# Altium footprint library 2.11-TQFP封装.PcbLib: 76 footprints (part 5 of 5)
Each footprint in its own frame and in the unit in brackets; x right, y up, seen from the top. Pads: shape width x height; smd on the part's side, far side on the other; paste and mask are expansions set on the pad; w line width, h text height; cw(c..) or ccw(c..) is an arc to the next point about the centre after c.
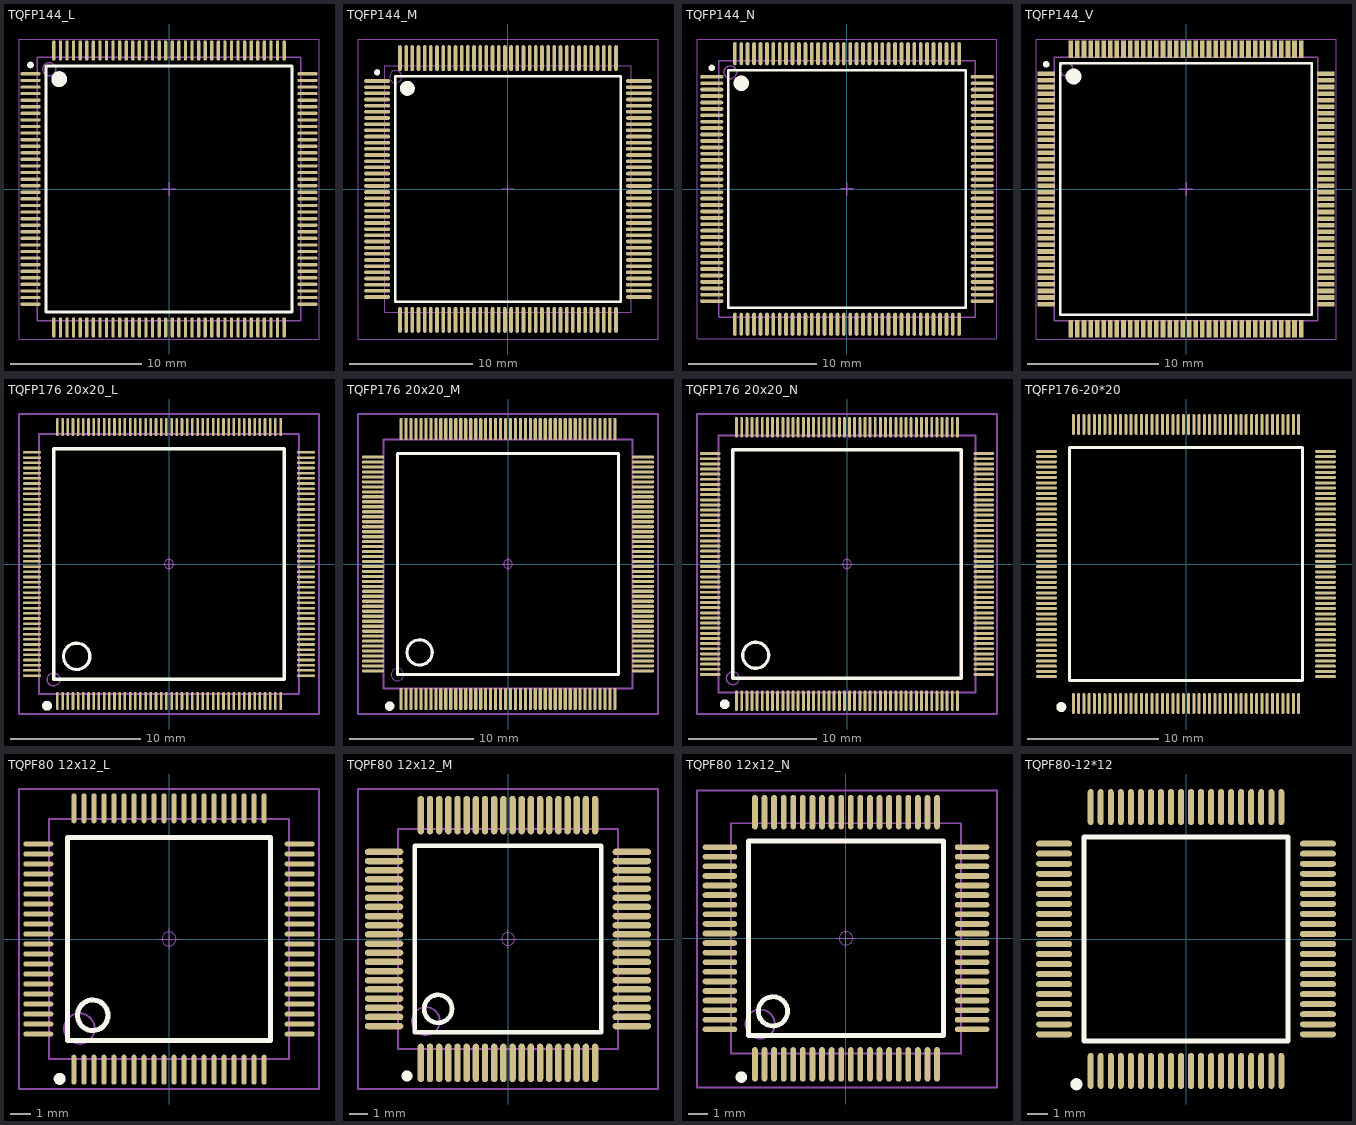
[diagram p4: the footprints below, top view; thin cyan lines are the x and y axes]

## TQFP144_L [mm] "Thin QFP, 144-Leads, Body 20x20mm, Pitch 0.5mm, IPC High Density      [ PCBѧϰȺ514746572 ]"
height 1.6
pads (144):
  oval 1.55x0.25 smd: 1(-10.525,8.75) 2(-10.525,8.25) 3(-10.525,7.75) 4(-10.525,7.25) 5(-10.525,6.75) 6(-10.525,6.25) 7(-10.525,5.75) 8(-10.525,5.25) 9(-10.525,4.75) 10(-10.525,4.25) 11(-10.525,3.75) 12(-10.525,3.25) 13(-10.525,2.75) 14(-10.525,2.25) 15(-10.525,1.75) 16(-10.525,1.25) 17(-10.525,0.75) 18(-10.525,0.25) 19(-10.525,-0.25) 20(-10.525,-0.75) 21(-10.525,-1.25) 22(-10.525,-1.75) 23(-10.525,-2.25) 24(-10.525,-2.75) 25(-10.525,-3.25) 26(-10.525,-3.75) 27(-10.525,-4.25) 28(-10.525,-4.75) 29(-10.525,-5.25) 30(-10.525,-5.75) 31(-10.525,-6.25) 32(-10.525,-6.75) 33(-10.525,-7.25) 34(-10.525,-7.75) 35(-10.525,-8.25) 36(-10.525,-8.75) 73(10.525,-8.75) 74(10.525,-8.25) 75(10.525,-7.75) 76(10.525,-7.25) 77(10.525,-6.75) 78(10.525,-6.25) 79(10.525,-5.75) 80(10.525,-5.25) 81(10.525,-4.75) 82(10.525,-4.25) 83(10.525,-3.75) 84(10.525,-3.25) 85(10.525,-2.75) 86(10.525,-2.25) 87(10.525,-1.75) 88(10.525,-1.25) 89(10.525,-0.75) 90(10.525,-0.25) 91(10.525,0.25) 92(10.525,0.75) 93(10.525,1.25) 94(10.525,1.75) 95(10.525,2.25) 96(10.525,2.75) 97(10.525,3.25) 98(10.525,3.75) 99(10.525,4.25) 100(10.525,4.75) 101(10.525,5.25) 102(10.525,5.75) 103(10.525,6.25) 104(10.525,6.75) 105(10.525,7.25) 106(10.525,7.75) 107(10.525,8.25) 108(10.525,8.75)
  oval 0.25x1.55 smd: 37(-8.75,-10.525) 38(-8.25,-10.525) 39(-7.75,-10.525) 40(-7.25,-10.525) 41(-6.75,-10.525) 42(-6.25,-10.525) 43(-5.75,-10.525) 44(-5.25,-10.525) 45(-4.75,-10.525) 46(-4.25,-10.525) 47(-3.75,-10.525) 48(-3.25,-10.525) 49(-2.75,-10.525) 50(-2.25,-10.525) 51(-1.75,-10.525) 52(-1.25,-10.525) 53(-0.75,-10.525) 54(-0.25,-10.525) 55(0.25,-10.525) 56(0.75,-10.525) 57(1.25,-10.525) 58(1.75,-10.525) 59(2.25,-10.525) 60(2.75,-10.525) 61(3.25,-10.525) 62(3.75,-10.525) 63(4.25,-10.525) 64(4.75,-10.525) 65(5.25,-10.525) 66(5.75,-10.525) 67(6.25,-10.525) 68(6.75,-10.525) 69(7.25,-10.525) 70(7.75,-10.525) 71(8.25,-10.525) 72(8.75,-10.525) 109(8.75,10.525) 110(8.25,10.525) 111(7.75,10.525) 112(7.25,10.525) 113(6.75,10.525) 114(6.25,10.525) 115(5.75,10.525) 116(5.25,10.525) 117(4.75,10.525) 118(4.25,10.525) 119(3.75,10.525) 120(3.25,10.525) 121(2.75,10.525) 122(2.25,10.525) 123(1.75,10.525) 124(1.25,10.525) 125(0.75,10.525) 126(0.25,10.525) 127(-0.25,10.525) 128(-0.75,10.525) 129(-1.25,10.525) 130(-1.75,10.525) 131(-2.25,10.525) 132(-2.75,10.525) 133(-3.25,10.525) 134(-3.75,10.525) 135(-4.25,10.525) 136(-4.75,10.525) 137(-5.25,10.525) 138(-5.75,10.525) 139(-6.25,10.525) 140(-6.75,10.525) 141(-7.25,10.525) 142(-7.75,10.525) 143(-8.25,10.525) 144(-8.75,10.525)
Top Overlay:
  circle w0.6: c-8.35,8.35 r0.3
  circle w0.25: c-10.525,9.425 r0.125
  lines w0.2: -9.35,-9.35 9.35,-9.35 9.35,9.35 -9.35,9.35 -9.35,-9.35
Mechanical 13:
  circle w0.1: c-9.1,9.1 r0.5
  lines w0.1: -10,-10 10,-10 10,10 -10,10 -10,-10
Mechanical 15:
  lines w0.05: -11.4,-11.4 11.4,-11.4 11.4,11.4 -11.4,11.4 -11.4,-11.4
  lines w0.1: -0.5,0 0.5,0 ; 0,-0.5 0,0.5
3D body "TQFP144_20x20.STEP": height 1.05, standoff 0, extent -11.002,-11.002 11.002,11.002

## TQFP144_M [mm] "Thin QFP, 144-Leads, Body 20x20mm, Pitch 0.5mm, IPC Low Density      [ PCBѧϰȺ514746572 ]"
height 1.6
pads (144):
  oval 2.1x0.3 smd: 1(-10.6,8.75) 2(-10.6,8.25) 3(-10.6,7.75) 4(-10.6,7.25) 5(-10.6,6.75) 6(-10.6,6.25) 7(-10.6,5.75) 8(-10.6,5.25) 9(-10.6,4.75) 10(-10.6,4.25) 11(-10.6,3.75) 12(-10.6,3.25) 13(-10.6,2.75) 14(-10.6,2.25) 15(-10.6,1.75) 16(-10.6,1.25) 17(-10.6,0.75) 18(-10.6,0.25) 19(-10.6,-0.25) 20(-10.6,-0.75) 21(-10.6,-1.25) 22(-10.6,-1.75) 23(-10.6,-2.25) 24(-10.6,-2.75) 25(-10.6,-3.25) 26(-10.6,-3.75) 27(-10.6,-4.25) 28(-10.6,-4.75) 29(-10.6,-5.25) 30(-10.6,-5.75) 31(-10.6,-6.25) 32(-10.6,-6.75) 33(-10.6,-7.25) 34(-10.6,-7.75) 35(-10.6,-8.25) 36(-10.6,-8.75) 73(10.6,-8.75) 74(10.6,-8.25) 75(10.6,-7.75) 76(10.6,-7.25) 77(10.6,-6.75) 78(10.6,-6.25) 79(10.6,-5.75) 80(10.6,-5.25) 81(10.6,-4.75) 82(10.6,-4.25) 83(10.6,-3.75) 84(10.6,-3.25) 85(10.6,-2.75) 86(10.6,-2.25) 87(10.6,-1.75) 88(10.6,-1.25) 89(10.6,-0.75) 90(10.6,-0.25) 91(10.6,0.25) 92(10.6,0.75) 93(10.6,1.25) 94(10.6,1.75) 95(10.6,2.25) 96(10.6,2.75) 97(10.6,3.25) 98(10.6,3.75) 99(10.6,4.25) 100(10.6,4.75) 101(10.6,5.25) 102(10.6,5.75) 103(10.6,6.25) 104(10.6,6.75) 105(10.6,7.25) 106(10.6,7.75) 107(10.6,8.25) 108(10.6,8.75)
  oval 0.3x2.1 smd: 37(-8.75,-10.6) 38(-8.25,-10.6) 39(-7.75,-10.6) 40(-7.25,-10.6) 41(-6.75,-10.6) 42(-6.25,-10.6) 43(-5.75,-10.6) 44(-5.25,-10.6) 45(-4.75,-10.6) 46(-4.25,-10.6) 47(-3.75,-10.6) 48(-3.25,-10.6) 49(-2.75,-10.6) 50(-2.25,-10.6) 51(-1.75,-10.6) 52(-1.25,-10.6) 53(-0.75,-10.6) 54(-0.25,-10.6) 55(0.25,-10.6) 56(0.75,-10.6) 57(1.25,-10.6) 58(1.75,-10.6) 59(2.25,-10.6) 60(2.75,-10.6) 61(3.25,-10.6) 62(3.75,-10.6) 63(4.25,-10.6) 64(4.75,-10.6) 65(5.25,-10.6) 66(5.75,-10.6) 67(6.25,-10.6) 68(6.75,-10.6) 69(7.25,-10.6) 70(7.75,-10.6) 71(8.25,-10.6) 72(8.75,-10.6) 109(8.75,10.6) 110(8.25,10.6) 111(7.75,10.6) 112(7.25,10.6) 113(6.75,10.6) 114(6.25,10.6) 115(5.75,10.6) 116(5.25,10.6) 117(4.75,10.6) 118(4.25,10.6) 119(3.75,10.6) 120(3.25,10.6) 121(2.75,10.6) 122(2.25,10.6) 123(1.75,10.6) 124(1.25,10.6) 125(0.75,10.6) 126(0.25,10.6) 127(-0.25,10.6) 128(-0.75,10.6) 129(-1.25,10.6) 130(-1.75,10.6) 131(-2.25,10.6) 132(-2.75,10.6) 133(-3.25,10.6) 134(-3.75,10.6) 135(-4.25,10.6) 136(-4.75,10.6) 137(-5.25,10.6) 138(-5.75,10.6) 139(-6.25,10.6) 140(-6.75,10.6) 141(-7.25,10.6) 142(-7.75,10.6) 143(-8.25,10.6) 144(-8.75,10.6)
Top Overlay:
  circle w0.25: c-10.6,9.45 r0.125
  circle w0.6: c-8.15,8.15 r0.3
  lines w0.2: -9.15,-9.15 -9.15,9.15 9.15,9.15 9.15,-9.15 -9.15,-9.15
Mechanical 13:
  circle w0.1: c-9.1,9.1 r0.5
  lines w0.1: -10,-10 -10,10 10,10 10,-10 -10,-10
Mechanical 15:
  lines w0.05: -12.15,-12.15 -12.15,12.15 12.15,12.15 12.15,-12.15 -12.15,-12.15
  lines w0.1: -0.5,0 0.5,0 ; 0,-0.5 0,0.5
3D body "TQFP144_20x20.STEP": height 1.05, standoff 0, extent -11.002,-11.002 11.002,11.002

## TQFP144_N [mm] "Thin QFP, 144-Leads, Body 20x20mm, Pitch 0.5mm, IPC Medium Density      [ PCBѧϰȺ514746572 ]"
height 1.6
pads (144):
  oval 1.8x0.3 smd: 1(-10.55,8.75) 2(-10.55,8.25) 3(-10.55,7.75) 4(-10.55,7.25) 5(-10.55,6.75) 6(-10.55,6.25) 7(-10.55,5.75) 8(-10.55,5.25) 9(-10.55,4.75) 10(-10.55,4.25) 11(-10.55,3.75) 12(-10.55,3.25) 13(-10.55,2.75) 14(-10.55,2.25) 15(-10.55,1.75) 16(-10.55,1.25) 17(-10.55,0.75) 18(-10.55,0.25) 19(-10.55,-0.25) 20(-10.55,-0.75) 21(-10.55,-1.25) 22(-10.55,-1.75) 23(-10.55,-2.25) 24(-10.55,-2.75) 25(-10.55,-3.25) 26(-10.55,-3.75) 27(-10.55,-4.25) 28(-10.55,-4.75) 29(-10.55,-5.25) 30(-10.55,-5.75) 31(-10.55,-6.25) 32(-10.55,-6.75) 33(-10.55,-7.25) 34(-10.55,-7.75) 35(-10.55,-8.25) 36(-10.55,-8.75) 73(10.55,-8.75) 74(10.55,-8.25) 75(10.55,-7.75) 76(10.55,-7.25) 77(10.55,-6.75) 78(10.55,-6.25) 79(10.55,-5.75) 80(10.55,-5.25) 81(10.55,-4.75) 82(10.55,-4.25) 83(10.55,-3.75) 84(10.55,-3.25) 85(10.55,-2.75) 86(10.55,-2.25) 87(10.55,-1.75) 88(10.55,-1.25) 89(10.55,-0.75) 90(10.55,-0.25) 91(10.55,0.25) 92(10.55,0.75) 93(10.55,1.25) 94(10.55,1.75) 95(10.55,2.25) 96(10.55,2.75) 97(10.55,3.25) 98(10.55,3.75) 99(10.55,4.25) 100(10.55,4.75) 101(10.55,5.25) 102(10.55,5.75) 103(10.55,6.25) 104(10.55,6.75) 105(10.55,7.25) 106(10.55,7.75) 107(10.55,8.25) 108(10.55,8.75)
  oval 0.3x1.8 smd: 37(-8.75,-10.55) 38(-8.25,-10.55) 39(-7.75,-10.55) 40(-7.25,-10.55) 41(-6.75,-10.55) 42(-6.25,-10.55) 43(-5.75,-10.55) 44(-5.25,-10.55) 45(-4.75,-10.55) 46(-4.25,-10.55) 47(-3.75,-10.55) 48(-3.25,-10.55) 49(-2.75,-10.55) 50(-2.25,-10.55) 51(-1.75,-10.55) 52(-1.25,-10.55) 53(-0.75,-10.55) 54(-0.25,-10.55) 55(0.25,-10.55) 56(0.75,-10.55) 57(1.25,-10.55) 58(1.75,-10.55) 59(2.25,-10.55) 60(2.75,-10.55) 61(3.25,-10.55) 62(3.75,-10.55) 63(4.25,-10.55) 64(4.75,-10.55) 65(5.25,-10.55) 66(5.75,-10.55) 67(6.25,-10.55) 68(6.75,-10.55) 69(7.25,-10.55) 70(7.75,-10.55) 71(8.25,-10.55) 72(8.75,-10.55) 109(8.75,10.55) 110(8.25,10.55) 111(7.75,10.55) 112(7.25,10.55) 113(6.75,10.55) 114(6.25,10.55) 115(5.75,10.55) 116(5.25,10.55) 117(4.75,10.55) 118(4.25,10.55) 119(3.75,10.55) 120(3.25,10.55) 121(2.75,10.55) 122(2.25,10.55) 123(1.75,10.55) 124(1.25,10.55) 125(0.75,10.55) 126(0.25,10.55) 127(-0.25,10.55) 128(-0.75,10.55) 129(-1.25,10.55) 130(-1.75,10.55) 131(-2.25,10.55) 132(-2.75,10.55) 133(-3.25,10.55) 134(-3.75,10.55) 135(-4.25,10.55) 136(-4.75,10.55) 137(-5.25,10.55) 138(-5.75,10.55) 139(-6.25,10.55) 140(-6.75,10.55) 141(-7.25,10.55) 142(-7.75,10.55) 143(-8.25,10.55) 144(-8.75,10.55)
Top Overlay:
  circle w0.25: c-10.55,9.45 r0.125
  circle w0.6: c-8.25,8.25 r0.3
  lines w0.2: -9.25,-9.25 -9.25,9.25 9.25,9.25 9.25,-9.25 -9.25,-9.25
Mechanical 13:
  circle w0.1: c-9.1,9.1 r0.5
  lines w0.1: -10,-10 -10,10 10,10 10,-10 -10,-10
Mechanical 15:
  lines w0.05: -11.7,-11.7 -11.7,11.7 11.7,11.7 11.7,-11.7 -11.7,-11.7
  lines w0.1: -0.5,0 0.5,0 ; 0,-0.5 0,0.5
3D body "TQFP144_20x20.STEP": height 1.05, standoff 0, extent -11.002,-11.002 11.002,11.002

## TQFP144_V [mm] "Thin QFP, 144-Leads, Body 20x20mm, Pitch 0.5mm, ST Recommended      [ PCBѧϰȺ514746572 ]"
height 1.6
pads (144):
  rect 1.35x0.35 smd: 1(-10.625,8.75) 2(-10.625,8.25) 3(-10.625,7.75) 4(-10.625,7.25) 5(-10.625,6.75) 6(-10.625,6.25) 7(-10.625,5.75) 8(-10.625,5.25) 9(-10.625,4.75) 10(-10.625,4.25) 11(-10.625,3.75) 12(-10.625,3.25) 13(-10.625,2.75) 14(-10.625,2.25) 15(-10.625,1.75) 16(-10.625,1.25) 17(-10.625,0.75) 18(-10.625,0.25) 19(-10.625,-0.25) 20(-10.625,-0.75) 21(-10.625,-1.25) 22(-10.625,-1.75) 23(-10.625,-2.25) 24(-10.625,-2.75) 25(-10.625,-3.25) 26(-10.625,-3.75) 27(-10.625,-4.25) 28(-10.625,-4.75) 29(-10.625,-5.25) 30(-10.625,-5.75) 31(-10.625,-6.25) 32(-10.625,-6.75) 33(-10.625,-7.25) 34(-10.625,-7.75) 35(-10.625,-8.25) 36(-10.625,-8.75) 73(10.625,-8.75) 74(10.625,-8.25) 75(10.625,-7.75) 76(10.625,-7.25) 77(10.625,-6.75) 78(10.625,-6.25) 79(10.625,-5.75) 80(10.625,-5.25) 81(10.625,-4.75) 82(10.625,-4.25) 83(10.625,-3.75) 84(10.625,-3.25) 85(10.625,-2.75) 86(10.625,-2.25) 87(10.625,-1.75) 88(10.625,-1.25) 89(10.625,-0.75) 90(10.625,-0.25) 91(10.625,0.25) 92(10.625,0.75) 93(10.625,1.25) 94(10.625,1.75) 95(10.625,2.25) 96(10.625,2.75) 97(10.625,3.25) 98(10.625,3.75) 99(10.625,4.25) 100(10.625,4.75) 101(10.625,5.25) 102(10.625,5.75) 103(10.625,6.25) 104(10.625,6.75) 105(10.625,7.25) 106(10.625,7.75) 107(10.625,8.25) 108(10.625,8.75)
  rect 0.35x1.35 smd: 37(-8.75,-10.625) 38(-8.25,-10.625) 39(-7.75,-10.625) 40(-7.25,-10.625) 41(-6.75,-10.625) 42(-6.25,-10.625) 43(-5.75,-10.625) 44(-5.25,-10.625) 45(-4.75,-10.625) 46(-4.25,-10.625) 47(-3.75,-10.625) 48(-3.25,-10.625) 49(-2.75,-10.625) 50(-2.25,-10.625) 51(-1.75,-10.625) 52(-1.25,-10.625) 53(-0.75,-10.625) 54(-0.25,-10.625) 55(0.25,-10.625) 56(0.75,-10.625) 57(1.25,-10.625) 58(1.75,-10.625) 59(2.25,-10.625) 60(2.75,-10.625) 61(3.25,-10.625) 62(3.75,-10.625) 63(4.25,-10.625) 64(4.75,-10.625) 65(5.25,-10.625) 66(5.75,-10.625) 67(6.25,-10.625) 68(6.75,-10.625) 69(7.25,-10.625) 70(7.75,-10.625) 71(8.25,-10.625) 72(8.75,-10.625) 109(8.75,10.625) 110(8.25,10.625) 111(7.75,10.625) 112(7.25,10.625) 113(6.75,10.625) 114(6.25,10.625) 115(5.75,10.625) 116(5.25,10.625) 117(4.75,10.625) 118(4.25,10.625) 119(3.75,10.625) 120(3.25,10.625) 121(2.75,10.625) 122(2.25,10.625) 123(1.75,10.625) 124(1.25,10.625) 125(0.75,10.625) 126(0.25,10.625) 127(-0.25,10.625) 128(-0.75,10.625) 129(-1.25,10.625) 130(-1.75,10.625) 131(-2.25,10.625) 132(-2.75,10.625) 133(-3.25,10.625) 134(-3.75,10.625) 135(-4.25,10.625) 136(-4.75,10.625) 137(-5.25,10.625) 138(-5.75,10.625) 139(-6.25,10.625) 140(-6.75,10.625) 141(-7.25,10.625) 142(-7.75,10.625) 143(-8.25,10.625) 144(-8.75,10.625)
Top Overlay:
  circle w0.6: c-8.55,8.55 r0.3
  circle w0.25: c-10.625,9.475 r0.125
  lines w0.2: -9.55,-9.55 9.55,-9.55 9.55,9.55 -9.55,9.55 -9.55,-9.55
Mechanical 13:
  circle w0.1: c-9.1,9.1 r0.5
  lines w0.1: -10,-10 10,-10 10,10 -10,10 -10,-10
Mechanical 15:
  lines w0.05: -11.4,-11.4 11.4,-11.4 11.4,11.4 -11.4,11.4 -11.4,-11.4
  lines w0.1: -0.5,0 0.5,0 ; 0,-0.5 0,0.5
3D body: height 1.6, standoff 0.05, extent -10,-10 10,10

## TQFP176 20x20_L [mm] "176脚，体宽：20x20mm, 脚距：0.4mm      [ PCB学习群514746572 ]"
height 1.6
pads (176):
  oval 0.2x1.4 smd: 1(-8.6,-10.552) 2(-8.2,-10.552) 3(-7.8,-10.552) 4(-7.4,-10.552) 5(-7,-10.552) 6(-6.6,-10.552) 7(-6.2,-10.552) 8(-5.8,-10.552) 9(-5.4,-10.552) 10(-5,-10.552) 11(-4.6,-10.552) 12(-4.2,-10.552) 13(-3.8,-10.552) 14(-3.4,-10.552) 15(-3,-10.552) 16(-2.6,-10.552) 17(-2.2,-10.552) 18(-1.8,-10.552) 19(-1.4,-10.552) 20(-1,-10.552) 21(-0.6,-10.552) 22(-0.2,-10.552) 23(0.2,-10.552) 24(0.6,-10.552) 25(1,-10.552) 26(1.4,-10.552) 27(1.8,-10.552) 28(2.2,-10.552) 29(2.6,-10.552) 30(3,-10.552) 31(3.4,-10.552) 32(3.8,-10.552) 33(4.2,-10.552) 34(4.6,-10.552) 35(5,-10.552) 36(5.4,-10.552) 37(5.8,-10.552) 38(6.2,-10.552) 39(6.6,-10.552) 40(7,-10.552) 41(7.4,-10.552) 42(7.8,-10.552) 43(8.2,-10.552) 44(8.6,-10.552) 89(8.6,10.552) 90(8.2,10.552) 91(7.8,10.552) 92(7.4,10.552) 93(7,10.552) 94(6.6,10.552) 95(6.2,10.552) 96(5.8,10.552) 97(5.4,10.552) 98(5,10.552) 99(4.6,10.552) 100(4.2,10.552) 101(3.8,10.552) 102(3.4,10.552) 103(3,10.552) 104(2.6,10.552) 105(2.2,10.552) 106(1.8,10.552) 107(1.4,10.552) 108(1,10.552) 109(0.6,10.552) 110(0.2,10.552) 111(-0.2,10.552) 112(-0.6,10.552) 113(-1,10.552) 114(-1.4,10.552) 115(-1.8,10.552) 116(-2.2,10.552) 117(-2.6,10.552) 118(-3,10.552) 119(-3.4,10.552) 120(-3.8,10.552) 121(-4.2,10.552) 122(-4.6,10.552) 123(-5,10.552) 124(-5.4,10.552) 125(-5.8,10.552) 126(-6.2,10.552) 127(-6.6,10.552) 128(-7,10.552) 129(-7.4,10.552) 130(-7.8,10.552) 131(-8.2,10.552) 132(-8.6,10.552)
  oval 1.4x0.2 smd: 45(10.552,-8.6) 46(10.552,-8.2) 47(10.552,-7.8) 48(10.552,-7.4) 49(10.552,-7) 50(10.552,-6.6) 51(10.552,-6.2) 52(10.552,-5.8) 53(10.552,-5.4) 54(10.552,-5) 55(10.552,-4.6) 56(10.552,-4.2) 57(10.552,-3.8) 58(10.552,-3.4) 59(10.552,-3) 60(10.552,-2.6) 61(10.552,-2.2) 62(10.552,-1.8) 63(10.552,-1.4) 64(10.552,-1) 65(10.552,-0.6) 66(10.552,-0.2) 67(10.552,0.2) 68(10.552,0.6) 69(10.552,1) 70(10.552,1.4) 71(10.552,1.8) 72(10.552,2.2) 73(10.552,2.6) 74(10.552,3) 75(10.552,3.4) 76(10.552,3.8) 77(10.552,4.2) 78(10.552,4.6) 79(10.552,5) 80(10.552,5.4) 81(10.552,5.8) 82(10.552,6.2) 83(10.552,6.6) 84(10.552,7) 85(10.552,7.4) 86(10.552,7.8) 87(10.552,8.2) 88(10.552,8.6) 133(-10.552,8.6) 134(-10.552,8.2) 135(-10.552,7.8) 136(-10.552,7.4) 137(-10.552,7) 138(-10.552,6.6) 139(-10.552,6.2) 140(-10.552,5.8) 141(-10.552,5.4) 142(-10.552,5) 143(-10.552,4.6) 144(-10.552,4.2) 145(-10.552,3.8) 146(-10.552,3.4) 147(-10.552,3) 148(-10.552,2.6) 149(-10.552,2.2) 150(-10.552,1.8) 151(-10.552,1.4) 152(-10.552,1) 153(-10.552,0.6) 154(-10.552,0.2) 155(-10.552,-0.2) 156(-10.552,-0.6) 157(-10.552,-1) 158(-10.552,-1.4) 159(-10.552,-1.8) 160(-10.552,-2.2) 161(-10.552,-2.6) 162(-10.552,-3) 163(-10.552,-3.4) 164(-10.552,-3.8) 165(-10.552,-4.2) 166(-10.552,-4.6) 167(-10.552,-5) 168(-10.552,-5.4) 169(-10.552,-5.8) 170(-10.552,-6.2) 171(-10.552,-6.6) 172(-10.552,-7) 173(-10.552,-7.4) 174(-10.552,-7.8) 175(-10.552,-8.2) 176(-10.552,-8.6)
Top Overlay:
  circle w0.508: c-9.398,-10.922 r0.127
  circle w0.254: c-7.112,-7.112 r1.016
  lines w0.254: -8.89,-8.89 8.89,-8.89 8.89,8.89 -8.89,8.89 -8.89,-8.89
Mechanical 13:
  circle w0.1: c-8.894,-8.894 r0.5
  lines w0.15: -10,-10 -10,10 10,10 10,-10 -10,-10
Mechanical 15:
  circle w0.05: c0,0 r0.35
  lines w0.05: -0.5,0 0.5,0 ; 0,-0.5 0,0.5
  lines w0.15: -11.557,-11.557 11.557,-11.557 11.557,11.557 -11.557,11.557 -11.557,-11.557
3D body "TQFP176_20x20.STEP": height 1.05, standoff 0, extent -11.002,-11.002 11.002,11.002

## TQFP176 20x20_M [mm] "176脚，体宽：20x20mm, 脚距：0.4mm      [ PCB学习群514746572 ]"
height 1.6
pads (176):
  oval 0.26x1.8 smd: 1(-8.6,-10.857) 2(-8.2,-10.857) 3(-7.8,-10.857) 4(-7.4,-10.857) 5(-7,-10.857) 6(-6.6,-10.857) 7(-6.2,-10.857) 8(-5.8,-10.857) 9(-5.4,-10.857) 10(-5,-10.857) 11(-4.6,-10.857) 12(-4.2,-10.857) 13(-3.8,-10.857) 14(-3.4,-10.857) 15(-3,-10.857) 16(-2.6,-10.857) 17(-2.2,-10.857) 18(-1.8,-10.857) 19(-1.4,-10.857) 20(-1,-10.857) 21(-0.6,-10.857) 22(-0.2,-10.857) 23(0.2,-10.857) 24(0.6,-10.857) 25(1,-10.857) 26(1.4,-10.857) 27(1.8,-10.857) 28(2.2,-10.857) 29(2.6,-10.857) 30(3,-10.857) 31(3.4,-10.857) 32(3.8,-10.857) 33(4.2,-10.857) 34(4.6,-10.857) 35(5,-10.857) 36(5.4,-10.857) 37(5.8,-10.857) 38(6.2,-10.857) 39(6.6,-10.857) 40(7,-10.857) 41(7.4,-10.857) 42(7.8,-10.857) 43(8.2,-10.857) 44(8.6,-10.857) 89(8.6,10.857) 90(8.2,10.857) 91(7.8,10.857) 92(7.4,10.857) 93(7,10.857) 94(6.6,10.857) 95(6.2,10.857) 96(5.8,10.857) 97(5.4,10.857) 98(5,10.857) 99(4.6,10.857) 100(4.2,10.857) 101(3.8,10.857) 102(3.4,10.857) 103(3,10.857) 104(2.6,10.857) 105(2.2,10.857) 106(1.8,10.857) 107(1.4,10.857) 108(1,10.857) 109(0.6,10.857) 110(0.2,10.857) 111(-0.2,10.857) 112(-0.6,10.857) 113(-1,10.857) 114(-1.4,10.857) 115(-1.8,10.857) 116(-2.2,10.857) 117(-2.6,10.857) 118(-3,10.857) 119(-3.4,10.857) 120(-3.8,10.857) 121(-4.2,10.857) 122(-4.6,10.857) 123(-5,10.857) 124(-5.4,10.857) 125(-5.8,10.857) 126(-6.2,10.857) 127(-6.6,10.857) 128(-7,10.857) 129(-7.4,10.857) 130(-7.8,10.857) 131(-8.2,10.857) 132(-8.6,10.857)
  oval 1.8x0.26 smd: 45(10.857,-8.6) 46(10.857,-8.2) 47(10.857,-7.8) 48(10.857,-7.4) 49(10.857,-7) 50(10.857,-6.6) 51(10.857,-6.2) 52(10.857,-5.8) 53(10.857,-5.4) 54(10.857,-5) 55(10.857,-4.6) 56(10.857,-4.2) 57(10.857,-3.8) 58(10.857,-3.4) 59(10.857,-3) 60(10.857,-2.6) 61(10.857,-2.2) 62(10.857,-1.8) 63(10.857,-1.4) 64(10.857,-1) 65(10.857,-0.6) 66(10.857,-0.2) 67(10.857,0.2) 68(10.857,0.6) 69(10.857,1) 70(10.857,1.4) 71(10.857,1.8) 72(10.857,2.2) 73(10.857,2.6) 74(10.857,3) 75(10.857,3.4) 76(10.857,3.8) 77(10.857,4.2) 78(10.857,4.6) 79(10.857,5) 80(10.857,5.4) 81(10.857,5.8) 82(10.857,6.2) 83(10.857,6.6) 84(10.857,7) 85(10.857,7.4) 86(10.857,7.8) 87(10.857,8.2) 88(10.857,8.6) 133(-10.857,8.6) 134(-10.857,8.2) 135(-10.857,7.8) 136(-10.857,7.4) 137(-10.857,7) 138(-10.857,6.6) 139(-10.857,6.2) 140(-10.857,5.8) 141(-10.857,5.4) 142(-10.857,5) 143(-10.857,4.6) 144(-10.857,4.2) 145(-10.857,3.8) 146(-10.857,3.4) 147(-10.857,3) 148(-10.857,2.6) 149(-10.857,2.2) 150(-10.857,1.8) 151(-10.857,1.4) 152(-10.857,1) 153(-10.857,0.6) 154(-10.857,0.2) 155(-10.857,-0.2) 156(-10.857,-0.6) 157(-10.857,-1) 158(-10.857,-1.4) 159(-10.857,-1.8) 160(-10.857,-2.2) 161(-10.857,-2.6) 162(-10.857,-3) 163(-10.857,-3.4) 164(-10.857,-3.8) 165(-10.857,-4.2) 166(-10.857,-4.6) 167(-10.857,-5) 168(-10.857,-5.4) 169(-10.857,-5.8) 170(-10.857,-6.2) 171(-10.857,-6.6) 172(-10.857,-7) 173(-10.857,-7.4) 174(-10.857,-7.8) 175(-10.857,-8.2) 176(-10.857,-8.6)
Top Overlay:
  circle w0.254: c-7.112,-7.112 r1.016
  circle w0.508: c-9.525,-11.43 r0.127
  lines w0.254: -8.89,-8.89 8.89,-8.89 8.89,8.89 -8.89,8.89 -8.89,-8.89
Mechanical 13:
  circle w0.1: c-8.894,-8.894 r0.5
  lines w0.15: -10,-10 -10,10 10,10 10,-10 -10,-10
Mechanical 15:
  circle w0.05: c0,0 r0.35
  lines w0.05: -0.5,0 0.5,0 ; 0,-0.5 0,0.5
  lines w0.15: -12.065,-12.065 12.065,-12.065 12.065,12.065 -12.065,12.065 -12.065,-12.065
3D body "TQFP176_20x20.STEP": height 1.05, standoff 0, extent -11.002,-11.002 11.002,11.002

## TQFP176 20x20_N [mm] "176脚，体宽：20x20mm, 脚距：0.4mm      [ PCB学习群514746572 ]"
height 1.6
pads (176):
  oval 0.23x1.6 smd: 1(-8.6,-10.654) 2(-8.2,-10.654) 3(-7.8,-10.654) 4(-7.4,-10.654) 5(-7,-10.654) 6(-6.6,-10.654) 7(-6.2,-10.654) 8(-5.8,-10.654) 9(-5.4,-10.654) 10(-5,-10.654) 11(-4.6,-10.654) 12(-4.2,-10.654) 13(-3.8,-10.654) 14(-3.4,-10.654) 15(-3,-10.654) 16(-2.6,-10.654) 17(-2.2,-10.654) 18(-1.8,-10.654) 19(-1.4,-10.654) 20(-1,-10.654) 21(-0.6,-10.654) 22(-0.2,-10.654) 23(0.2,-10.654) 24(0.6,-10.654) 25(1,-10.654) 26(1.4,-10.654) 27(1.8,-10.654) 28(2.2,-10.654) 29(2.6,-10.654) 30(3,-10.654) 31(3.4,-10.654) 32(3.8,-10.654) 33(4.2,-10.654) 34(4.6,-10.654) 35(5,-10.654) 36(5.4,-10.654) 37(5.8,-10.654) 38(6.2,-10.654) 39(6.6,-10.654) 40(7,-10.654) 41(7.4,-10.654) 42(7.8,-10.654) 43(8.2,-10.654) 44(8.6,-10.654) 89(8.6,10.654) 90(8.2,10.654) 91(7.8,10.654) 92(7.4,10.654) 93(7,10.654) 94(6.6,10.654) 95(6.2,10.654) 96(5.8,10.654) 97(5.4,10.654) 98(5,10.654) 99(4.6,10.654) 100(4.2,10.654) 101(3.8,10.654) 102(3.4,10.654) 103(3,10.654) 104(2.6,10.654) 105(2.2,10.654) 106(1.8,10.654) 107(1.4,10.654) 108(1,10.654) 109(0.6,10.654) 110(0.2,10.654) 111(-0.2,10.654) 112(-0.6,10.654) 113(-1,10.654) 114(-1.4,10.654) 115(-1.8,10.654) 116(-2.2,10.654) 117(-2.6,10.654) 118(-3,10.654) 119(-3.4,10.654) 120(-3.8,10.654) 121(-4.2,10.654) 122(-4.6,10.654) 123(-5,10.654) 124(-5.4,10.654) 125(-5.8,10.654) 126(-6.2,10.654) 127(-6.6,10.654) 128(-7,10.654) 129(-7.4,10.654) 130(-7.8,10.654) 131(-8.2,10.654) 132(-8.6,10.654)
  oval 1.6x0.23 smd: 45(10.654,-8.6) 46(10.654,-8.2) 47(10.654,-7.8) 48(10.654,-7.4) 49(10.654,-7) 50(10.654,-6.6) 51(10.654,-6.2) 52(10.654,-5.8) 53(10.654,-5.4) 54(10.654,-5) 55(10.654,-4.6) 56(10.654,-4.2) 57(10.654,-3.8) 58(10.654,-3.4) 59(10.654,-3) 60(10.654,-2.6) 61(10.654,-2.2) 62(10.654,-1.8) 63(10.654,-1.4) 64(10.654,-1) 65(10.654,-0.6) 66(10.654,-0.2) 67(10.654,0.2) 68(10.654,0.6) 69(10.654,1) 70(10.654,1.4) 71(10.654,1.8) 72(10.654,2.2) 73(10.654,2.6) 74(10.654,3) 75(10.654,3.4) 76(10.654,3.8) 77(10.654,4.2) 78(10.654,4.6) 79(10.654,5) 80(10.654,5.4) 81(10.654,5.8) 82(10.654,6.2) 83(10.654,6.6) 84(10.654,7) 85(10.654,7.4) 86(10.654,7.8) 87(10.654,8.2) 88(10.654,8.6) 133(-10.654,8.6) 134(-10.654,8.2) 135(-10.654,7.8) 136(-10.654,7.4) 137(-10.654,7) 138(-10.654,6.6) 139(-10.654,6.2) 140(-10.654,5.8) 141(-10.654,5.4) 142(-10.654,5) 143(-10.654,4.6) 144(-10.654,4.2) 145(-10.654,3.8) 146(-10.654,3.4) 147(-10.654,3) 148(-10.654,2.6) 149(-10.654,2.2) 150(-10.654,1.8) 151(-10.654,1.4) 152(-10.654,1) 153(-10.654,0.6) 154(-10.654,0.2) 155(-10.654,-0.2) 156(-10.654,-0.6) 157(-10.654,-1) 158(-10.654,-1.4) 159(-10.654,-1.8) 160(-10.654,-2.2) 161(-10.654,-2.6) 162(-10.654,-3) 163(-10.654,-3.4) 164(-10.654,-3.8) 165(-10.654,-4.2) 166(-10.654,-4.6) 167(-10.654,-5) 168(-10.654,-5.4) 169(-10.654,-5.8) 170(-10.654,-6.2) 171(-10.654,-6.6) 172(-10.654,-7) 173(-10.654,-7.4) 174(-10.654,-7.8) 175(-10.654,-8.2) 176(-10.654,-8.6)
Top Overlay:
  circle w0.508: c-9.525,-10.922 r0.127
  circle w0.254: c-7.112,-7.112 r1.016
  lines w0.254: -8.89,-8.89 8.89,-8.89 8.89,8.89 -8.89,8.89 -8.89,-8.89
Mechanical 13:
  circle w0.1: c-8.894,-8.894 r0.5
  lines w0.15: -10,-10 -10,10 10,10 10,-10 -10,-10
Mechanical 15:
  circle w0.05: c0,0 r0.35
  lines w0.05: -0.5,0 0.5,0 ; 0,-0.5 0,0.5
  lines w0.15: -11.684,-11.684 11.684,-11.684 11.684,11.684 -11.684,11.684 -11.684,-11.684
3D body "TQFP176_20x20.STEP": height 1.05, standoff 0, extent -11.002,-11.002 11.002,11.002

## TQFP176-20*20 [mm] "20x20mm, 0.4mm      [ PCBѧϰȺ514746572 ]"
pads (176):
  oval 0.23x1.6 smd: 1(-8.6,-10.654) 2(-8.2,-10.654) 3(-7.8,-10.654) 4(-7.4,-10.654) 5(-7,-10.654) 6(-6.6,-10.654) 7(-6.2,-10.654) 8(-5.8,-10.654) 9(-5.4,-10.654) 10(-5,-10.654) 11(-4.6,-10.654) 12(-4.2,-10.654) 13(-3.8,-10.654) 14(-3.4,-10.654) 15(-3,-10.654) 16(-2.6,-10.654) 17(-2.2,-10.654) 18(-1.8,-10.654) 19(-1.4,-10.654) 20(-1,-10.654) 21(-0.6,-10.654) 22(-0.2,-10.654) 23(0.2,-10.654) 24(0.6,-10.654) 25(1,-10.654) 26(1.4,-10.654) 27(1.8,-10.654) 28(2.2,-10.654) 29(2.6,-10.654) 30(3,-10.654) 31(3.4,-10.654) 32(3.8,-10.654) 33(4.2,-10.654) 34(4.6,-10.654) 35(5,-10.654) 36(5.4,-10.654) 37(5.8,-10.654) 38(6.2,-10.654) 39(6.6,-10.654) 40(7,-10.654) 41(7.4,-10.654) 42(7.8,-10.654) 43(8.2,-10.654) 44(8.6,-10.654) 89(8.6,10.654) 90(8.2,10.654) 91(7.8,10.654) 92(7.4,10.654) 93(7,10.654) 94(6.6,10.654) 95(6.2,10.654) 96(5.8,10.654) 97(5.4,10.654) 98(5,10.654) 99(4.6,10.654) 100(4.2,10.654) 101(3.8,10.654) 102(3.4,10.654) 103(3,10.654) 104(2.6,10.654) 105(2.2,10.654) 106(1.8,10.654) 107(1.4,10.654) 108(1,10.654) 109(0.6,10.654) 110(0.2,10.654) 111(-0.2,10.654) 112(-0.6,10.654) 113(-1,10.654) 114(-1.4,10.654) 115(-1.8,10.654) 116(-2.2,10.654) 117(-2.6,10.654) 118(-3,10.654) 119(-3.4,10.654) 120(-3.8,10.654) 121(-4.2,10.654) 122(-4.6,10.654) 123(-5,10.654) 124(-5.4,10.654) 125(-5.8,10.654) 126(-6.2,10.654) 127(-6.6,10.654) 128(-7,10.654) 129(-7.4,10.654) 130(-7.8,10.654) 131(-8.2,10.654) 132(-8.6,10.654)
  oval 1.6x0.23 smd: 45(10.654,-8.6) 46(10.654,-8.2) 47(10.654,-7.8) 48(10.654,-7.4) 49(10.654,-7) 50(10.654,-6.6) 51(10.654,-6.2) 52(10.654,-5.8) 53(10.654,-5.4) 54(10.654,-5) 55(10.654,-4.6) 56(10.654,-4.2) 57(10.654,-3.8) 58(10.654,-3.4) 59(10.654,-3) 60(10.654,-2.6) 61(10.654,-2.2) 62(10.654,-1.8) 63(10.654,-1.4) 64(10.654,-1) 65(10.654,-0.6) 66(10.654,-0.2) 67(10.654,0.2) 68(10.654,0.6) 69(10.654,1) 70(10.654,1.4) 71(10.654,1.8) 72(10.654,2.2) 73(10.654,2.6) 74(10.654,3) 75(10.654,3.4) 76(10.654,3.8) 77(10.654,4.2) 78(10.654,4.6) 79(10.654,5) 80(10.654,5.4) 81(10.654,5.8) 82(10.654,6.2) 83(10.654,6.6) 84(10.654,7) 85(10.654,7.4) 86(10.654,7.8) 87(10.654,8.2) 88(10.654,8.6) 133(-10.654,8.6) 134(-10.654,8.2) 135(-10.654,7.8) 136(-10.654,7.4) 137(-10.654,7) 138(-10.654,6.6) 139(-10.654,6.2) 140(-10.654,5.8) 141(-10.654,5.4) 142(-10.654,5) 143(-10.654,4.6) 144(-10.654,4.2) 145(-10.654,3.8) 146(-10.654,3.4) 147(-10.654,3) 148(-10.654,2.6) 149(-10.654,2.2) 150(-10.654,1.8) 151(-10.654,1.4) 152(-10.654,1) 153(-10.654,0.6) 154(-10.654,0.2) 155(-10.654,-0.2) 156(-10.654,-0.6) 157(-10.654,-1) 158(-10.654,-1.4) 159(-10.654,-1.8) 160(-10.654,-2.2) 161(-10.654,-2.6) 162(-10.654,-3) 163(-10.654,-3.4) 164(-10.654,-3.8) 165(-10.654,-4.2) 166(-10.654,-4.6) 167(-10.654,-5) 168(-10.654,-5.4) 169(-10.654,-5.8) 170(-10.654,-6.2) 171(-10.654,-6.6) 172(-10.654,-7) 173(-10.654,-7.4) 174(-10.654,-7.8) 175(-10.654,-8.2) 176(-10.654,-8.6)
Top Overlay:
  circle w0.508: c-9.525,-10.922 r0.127
  lines w0.254: -8.89,-8.89 -8.89,8.89 8.89,8.89 8.89,-8.89 -8.89,-8.89
3D body "TQFP176_20x20.STEP": height 1.05, standoff 0, extent -11.002,-11.002 11.002,11.002

## TQPF80 12x12_L [mm] "80脚，体宽：12x12mm, 脚距：0.5mm      [ PCB学习群514746572 ]"
pads (80):
  oval 0.25x1.5 smd: 1(-4.75,-6.525) 2(-4.25,-6.525) 3(-3.75,-6.525) 4(-3.25,-6.525) 5(-2.75,-6.525) 6(-2.25,-6.525) 7(-1.75,-6.525) 8(-1.25,-6.525) 9(-0.75,-6.525) 10(-0.25,-6.525) 11(0.25,-6.525) 12(0.75,-6.525) 13(1.25,-6.525) 14(1.75,-6.525) 15(2.25,-6.525) 16(2.75,-6.525) 17(3.25,-6.525) 18(3.75,-6.525) 19(4.25,-6.525) 20(4.75,-6.525) 41(4.75,6.525) 42(4.25,6.525) 43(3.75,6.525) 44(3.25,6.525) 45(2.75,6.525) 46(2.25,6.525) 47(1.75,6.525) 48(1.25,6.525) 49(0.75,6.525) 50(0.25,6.525) 51(-0.25,6.525) 52(-0.75,6.525) 53(-1.25,6.525) 54(-1.75,6.525) 55(-2.25,6.525) 56(-2.75,6.525) 57(-3.25,6.525) 58(-3.75,6.525) 59(-4.25,6.525) 60(-4.75,6.525)
  oval 1.5x0.25 smd: 21(6.525,-4.75) 22(6.525,-4.25) 23(6.525,-3.75) 24(6.525,-3.25) 25(6.525,-2.75) 26(6.525,-2.25) 27(6.525,-1.75) 28(6.525,-1.25) 29(6.525,-0.75) 30(6.525,-0.25) 31(6.525,0.25) 32(6.525,0.75) 33(6.525,1.25) 34(6.525,1.75) 35(6.525,2.25) 36(6.525,2.75) 37(6.525,3.25) 38(6.525,3.75) 39(6.525,4.25) 40(6.525,4.75) 61(-6.525,4.75) 62(-6.525,4.25) 63(-6.525,3.75) 64(-6.525,3.25) 65(-6.525,2.75) 66(-6.525,2.25) 67(-6.525,1.75) 68(-6.525,1.25) 69(-6.525,0.75) 70(-6.525,0.25) 71(-6.525,-0.25) 72(-6.525,-0.75) 73(-6.525,-1.25) 74(-6.525,-1.75) 75(-6.525,-2.25) 76(-6.525,-2.75) 77(-6.525,-3.25) 78(-6.525,-3.75) 79(-6.525,-4.25) 80(-6.525,-4.75)
Top Overlay:
  circle w0.35: c-5.461,-6.985 r0.125
  circle w0.254: c-3.81,-3.81 r0.762
  lines w0.254: -5.08,-5.08 5.08,-5.08 5.08,5.08 -5.08,5.08 -5.08,-5.08
Mechanical 13:
  circle w0.1: c-4.476,-4.476 r0.762
  lines w0.1: -6,-6 6,-6 6,6 -6,6 -6,-6
Mechanical 15:
  circle w0.05: c0,0 r0.35
  lines w0.05: -0.5,0 0.5,0 ; 0,-0.5 0,0.5
  lines w0.1: -7.493,-7.493 7.493,-7.493 7.493,7.493 -7.493,7.493 -7.493,-7.493
3D body "TQFP80_12x12.STEP": height 1.05, standoff 0, extent -7.002,-7.002 7.002,7.002

## TQPF80 12x12_M [mm] "80脚，体宽：12x12mm, 脚距：0.5mm      [ PCB学习群514746572 ]"
pads (80):
  oval 0.35x2.1 smd: 1(-4.752,-6.754) 2(-4.252,-6.754) 3(-3.752,-6.754) 4(-3.252,-6.754) 5(-2.752,-6.754) 6(-2.252,-6.754) 7(-1.752,-6.754) 8(-1.252,-6.754) 9(-0.752,-6.754) 10(-0.252,-6.754) 11(0.248,-6.754) 12(0.748,-6.754) 13(1.248,-6.754) 14(1.748,-6.754) 15(2.248,-6.754) 16(2.748,-6.754) 17(3.248,-6.754) 18(3.748,-6.754) 19(4.248,-6.754) 20(4.748,-6.754) 41(4.748,6.754) 42(4.248,6.754) 43(3.748,6.754) 44(3.248,6.754) 45(2.748,6.754) 46(2.248,6.754) 47(1.748,6.754) 48(1.248,6.754) 49(0.748,6.754) 50(0.248,6.754) 51(-0.252,6.754) 52(-0.752,6.754) 53(-1.252,6.754) 54(-1.752,6.754) 55(-2.252,6.754) 56(-2.752,6.754) 57(-3.252,6.754) 58(-3.752,6.754) 59(-4.252,6.754) 60(-4.752,6.754)
  oval 2.1x0.35 smd: 21(6.752,-4.75) 22(6.752,-4.25) 23(6.752,-3.75) 24(6.752,-3.25) 25(6.752,-2.75) 26(6.752,-2.25) 27(6.752,-1.75) 28(6.752,-1.25) 29(6.752,-0.75) 30(6.752,-0.25) 31(6.752,0.25) 32(6.752,0.75) 33(6.752,1.25) 34(6.752,1.75) 35(6.752,2.25) 36(6.752,2.75) 37(6.752,3.25) 38(6.752,3.75) 39(6.752,4.25) 40(6.752,4.75) 61(-6.756,4.75) 62(-6.756,4.25) 63(-6.756,3.75) 64(-6.756,3.25) 65(-6.756,2.75) 66(-6.756,2.25) 67(-6.756,1.75) 68(-6.756,1.25) 69(-6.756,0.75) 70(-6.756,0.25) 71(-6.756,-0.25) 72(-6.756,-0.75) 73(-6.756,-1.25) 74(-6.756,-1.75) 75(-6.756,-2.25) 76(-6.756,-2.75) 77(-6.756,-3.25) 78(-6.756,-3.75) 79(-6.756,-4.25) 80(-6.756,-4.75)
Top Overlay:
  circle w0.254: c-3.812,-3.81 r0.762
  circle w0.35: c-5.512,-7.468 r0.125
  lines w0.254: -5.082,-5.08 -5.082,5.08 5.078,5.08 5.078,-5.08 -5.082,-5.08
Mechanical 13:
  circle w0.1: c-4.478,-4.476 r0.762
  lines w0.1: -6.002,-6 -6.002,6 5.998,6 5.998,-6 -6.002,-6
Mechanical 15:
  circle w0.05: c-0.002,0 r0.35
  lines w0.05: -0.502,0 0.498,0 ; -0.002,-0.5 -0.002,0.5
  lines w0.1: -8.179,-8.179 -8.179,8.179 8.179,8.179 8.179,-8.179 -8.179,-8.179
3D body "TQFP80_12x12.STEP": height 1.05, standoff 0, extent -7.002,-7.002 7.002,7.002

## TQPF80 12x12_N [mm] "80脚，体宽：12x12mm, 脚距：0.5mm      [ PCB学习群514746572 ]"
pads (80):
  oval 0.3x1.8 smd: 1(-4.75,-6.576) 2(-4.25,-6.576) 3(-3.75,-6.576) 4(-3.25,-6.576) 5(-2.75,-6.576) 6(-2.25,-6.576) 7(-1.75,-6.576) 8(-1.25,-6.576) 9(-0.75,-6.576) 10(-0.25,-6.576) 11(0.25,-6.576) 12(0.75,-6.576) 13(1.25,-6.576) 14(1.75,-6.576) 15(2.25,-6.576) 16(2.75,-6.576) 17(3.25,-6.576) 18(3.75,-6.576) 19(4.25,-6.576) 20(4.75,-6.576) 41(4.75,6.576) 42(4.25,6.576) 43(3.75,6.576) 44(3.25,6.576) 45(2.75,6.576) 46(2.25,6.576) 47(1.75,6.576) 48(1.25,6.576) 49(0.75,6.576) 50(0.25,6.576) 51(-0.25,6.576) 52(-0.75,6.576) 53(-1.25,6.576) 54(-1.75,6.576) 55(-2.25,6.576) 56(-2.75,6.576) 57(-3.25,6.576) 58(-3.75,6.576) 59(-4.25,6.576) 60(-4.75,6.576)
  oval 1.8x0.3 smd: 21(6.576,-4.75) 22(6.576,-4.25) 23(6.576,-3.75) 24(6.576,-3.25) 25(6.576,-2.75) 26(6.576,-2.25) 27(6.576,-1.75) 28(6.576,-1.25) 29(6.576,-0.75) 30(6.576,-0.25) 31(6.576,0.25) 32(6.576,0.75) 33(6.576,1.25) 34(6.576,1.75) 35(6.576,2.25) 36(6.576,2.75) 37(6.576,3.25) 38(6.576,3.75) 39(6.576,4.25) 40(6.576,4.75) 61(-6.576,4.75) 62(-6.576,4.25) 63(-6.576,3.75) 64(-6.576,3.25) 65(-6.576,2.75) 66(-6.576,2.25) 67(-6.576,1.75) 68(-6.576,1.25) 69(-6.576,0.75) 70(-6.576,0.25) 71(-6.576,-0.25) 72(-6.576,-0.75) 73(-6.576,-1.25) 74(-6.576,-1.75) 75(-6.576,-2.25) 76(-6.576,-2.75) 77(-6.576,-3.25) 78(-6.576,-3.75) 79(-6.576,-4.25) 80(-6.576,-4.75)
Top Overlay:
  circle w0.35: c-5.459,-7.239 r0.125
  circle w0.254: c-3.81,-3.81 r0.762
  lines w0.254: -5.08,-5.08 5.08,-5.08 5.08,5.08 -5.08,5.08 -5.08,-5.08
Mechanical 13:
  circle w0.1: c-4.476,-4.476 r0.762
  lines w0.1: -6,-6 6,-6 6,6 -6,6 -6,-6
Mechanical 15:
  circle w0.05: c0,0 r0.35
  lines w0.05: -0.5,0 0.5,0 ; 0,-0.5 0,0.5
  lines w0.1: -7.77,-7.773 7.876,-7.773 7.876,7.696 -7.77,7.696 -7.77,-7.773
3D body "TQFP80_12x12.STEP": height 1.05, standoff 0, extent -7,-7.002 7.005,7.002

## TQPF80-12*12 [mm] "12x12mm, 0.5mm      [ PCBѧϰȺ514746572 ]"
pads (80):
  oval 0.3x1.8 smd: 1(-4.75,-6.576) 2(-4.25,-6.576) 3(-3.75,-6.576) 4(-3.25,-6.576) 5(-2.75,-6.576) 6(-2.25,-6.576) 7(-1.75,-6.576) 8(-1.25,-6.576) 9(-0.75,-6.576) 10(-0.25,-6.576) 11(0.25,-6.576) 12(0.75,-6.576) 13(1.25,-6.576) 14(1.75,-6.576) 15(2.25,-6.576) 16(2.75,-6.576) 17(3.25,-6.576) 18(3.75,-6.576) 19(4.25,-6.576) 20(4.75,-6.576) 41(4.75,6.576) 42(4.25,6.576) 43(3.75,6.576) 44(3.25,6.576) 45(2.75,6.576) 46(2.25,6.576) 47(1.75,6.576) 48(1.25,6.576) 49(0.75,6.576) 50(0.25,6.576) 51(-0.25,6.576) 52(-0.75,6.576) 53(-1.25,6.576) 54(-1.75,6.576) 55(-2.25,6.576) 56(-2.75,6.576) 57(-3.25,6.576) 58(-3.75,6.576) 59(-4.25,6.576) 60(-4.75,6.576)
  oval 1.8x0.3 smd: 21(6.576,-4.75) 22(6.576,-4.25) 23(6.576,-3.75) 24(6.576,-3.25) 25(6.576,-2.75) 26(6.576,-2.25) 27(6.576,-1.75) 28(6.576,-1.25) 29(6.576,-0.75) 30(6.576,-0.25) 31(6.576,0.25) 32(6.576,0.75) 33(6.576,1.25) 34(6.576,1.75) 35(6.576,2.25) 36(6.576,2.75) 37(6.576,3.25) 38(6.576,3.75) 39(6.576,4.25) 40(6.576,4.75) 61(-6.576,4.75) 62(-6.576,4.25) 63(-6.576,3.75) 64(-6.576,3.25) 65(-6.576,2.75) 66(-6.576,2.25) 67(-6.576,1.75) 68(-6.576,1.25) 69(-6.576,0.75) 70(-6.576,0.25) 71(-6.576,-0.25) 72(-6.576,-0.75) 73(-6.576,-1.25) 74(-6.576,-1.75) 75(-6.576,-2.25) 76(-6.576,-2.75) 77(-6.576,-3.25) 78(-6.576,-3.75) 79(-6.576,-4.25) 80(-6.576,-4.75)
Top Overlay:
  circle w0.35: c-5.459,-7.239 r0.125
  lines w0.254: -5.08,-5.08 -5.08,5.08 5.08,5.08 5.08,-5.08 -5.08,-5.08
3D body "TQFP80_12x12.STEP": height 1.05, standoff 0, extent -7.002,-7.002 7.002,7.002